# Altium schematic symbol library jlcpcb_2025_04_inductors_extended_0402.schlib: 1396 symbols (part 2 of 8) (continued)
## L-07C2N7SV6T (continued)
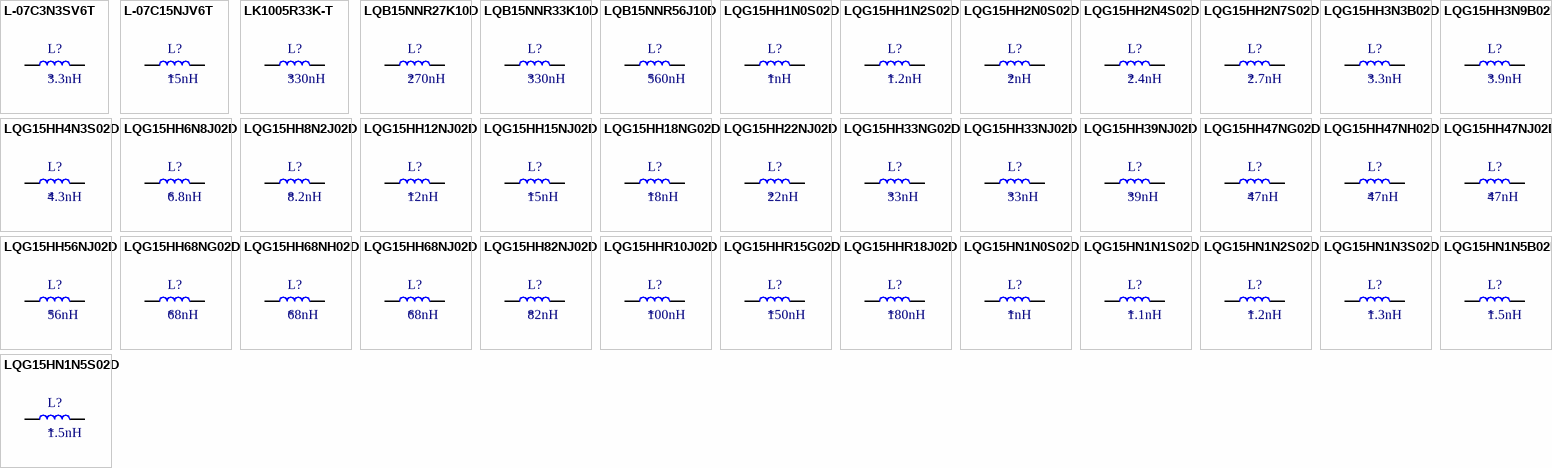
[diagram p7: symbols L-07C3N3SV6T to LQG15HN1N5S02D]

## L-07C3N3SV6T
designator L?  Inductance: 3.3nH
Inductor, 3.3nH, 190mΩ, 300mA, SMD 0402; Manufacturer: Johanson Dielectrics; Manufacturer Part Number: L-07C3N3SV6T; Self-Resonant Frequency: 8.5GHz; Q Factor: 8@100MHz; Package Size: 0402; JLCPCB Basic Part: No; JLCPCB Part Number: C5338661; Supplier 1: LCSC; Category: Inductors; Supplier Part Number 1: C5338661; Rated Current: 300mA; DC Resistance: 190mΩ; RoHS: Yes; ComponentLink1Description: Datasheet; ComponentLink1URL: https://wmsc.lcsc.com/wmsc/upload/file/pdf/v2/lcsc/2212192008_Johanson-Dielectrics-L-07C3N3SV6T_C5338661.pdf; ComponentLink2Description: JLCPCB Part URL; ComponentLink2URL: https://jlcpcb.com/partdetail/C5338661; ComponentLink3Description: LCSC Part URL; ComponentLink3URL: https://lcsc.com/product-detail/Inductors-SMD_Johanson-Dielectrics-Johanson-Dielectrics-L-07C3N3SV6T_C5338661.html
footprint IND-0402 (0402 (1005M) Inductor)
pins: 1, 2

## L-07C15NJV6T
designator L?  Inductance: 15nH
Inductor, 15nH, ±5%, 600mΩ, 250mA, SMD 0402; Manufacturer: Johanson Dielectrics; Manufacturer Part Number: L-07C15NJV6T; Q Factor: 8@100MHz; Package Size: 0402; JLCPCB Basic Part: No; JLCPCB Part Number: C2917773; Supplier 1: LCSC; Category: Inductors; Supplier Part Number 1: C2917773; Tolerance: ±5%; Rated Current: 250mA; DC Resistance: 600mΩ; RoHS: Yes; ComponentLink1Description: Datasheet; ComponentLink1URL: https://wmsc.lcsc.com/wmsc/upload/file/pdf/v2/lcsc/2203311630_Johanson-Dielectrics-L-07C15NJV6T_C2917773.pdf; ComponentLink2Description: JLCPCB Part URL; ComponentLink2URL: https://jlcpcb.com/partdetail/C2917773; ComponentLink3Description: LCSC Part URL; ComponentLink3URL: https://lcsc.com/product-detail/Inductors-SMD_Johanson-Dielectrics-Johanson-Dielectrics-L-07C15NJV6T_C2917773.html
footprint IND-0402 (0402 (1005M) Inductor)
pins: 1, 2

## LK1005R33K-T
designator L?  Inductance: 330nH
Inductor, 330nH, ±10%, 1.05Ω, 25mA, SMD 0402; Manufacturer: Taiyo Yuden; Manufacturer Part Number: LK1005R33K-T; Q Factor: 10@25MHz; Package Size: 0402; JLCPCB Basic Part: No; JLCPCB Part Number: C524943; Supplier 1: LCSC; Category: Inductors; Supplier Part Number 1: C524943; Tolerance: ±10%; Rated Current: 25mA; DC Resistance: 1.05Ω; RoHS: Yes; ComponentLink1Description: Datasheet; ComponentLink1URL: https://wmsc.lcsc.com/wmsc/upload/file/pdf/v2/lcsc/2006241834_Taiyo-Yuden-LK1005R33K-T_C524943.pdf; ComponentLink2Description: JLCPCB Part URL; ComponentLink2URL: https://jlcpcb.com/partdetail/C524943; ComponentLink3Description: LCSC Part URL; ComponentLink3URL: https://lcsc.com/product-detail/Inductors-SMD_Taiyo-Yuden-Taiyo-Yuden-LK1005R33K-T_C524943.html
footprint IND-0402 (0402 (1005M) Inductor)
pins: 1, 2

## LQB15NNR27K10D
designator L?  Inductance: 270nH
Inductor, 270nH, ±10%, 410mΩ, 330mA, SMD 0402; Manufacturer: Murata Electronics; Manufacturer Part Number: LQB15NNR27K10D; Self-Resonant Frequency: 80MHz; Q Factor: 10@25MHz; Package Size: 0402; JLCPCB Basic Part: No; JLCPCB Part Number: C907954; Supplier 1: LCSC; Category: Inductors; Supplier Part Number 1: C907954; Tolerance: ±10%; Rated Current: 330mA; DC Resistance: 410mΩ; RoHS: Yes; ComponentLink1Description: Datasheet; ComponentLink1URL: https://wmsc.lcsc.com/wmsc/upload/file/pdf/v2/lcsc/2304140030_Murata-Electronics-LQB15NNR27K10D_C907954.pdf; ComponentLink2Description: JLCPCB Part URL; ComponentLink2URL: https://jlcpcb.com/partdetail/C907954; ComponentLink3Description: LCSC Part URL; ComponentLink3URL: https://lcsc.com/product-detail/Inductors-SMD_Murata-Electronics-Murata-Electronics-LQB15NNR27K10D_C907954.html
footprint IND-0402 (0402 (1005M) Inductor)
pins: 1, 2

## LQB15NNR33K10D
designator L?  Inductance: 330nH
Inductor, 330nH, ±10%, 480mΩ, 300mA, SMD 0402; Manufacturer: Murata Electronics; Manufacturer Part Number: LQB15NNR33K10D; Self-Resonant Frequency: 80MHz; Q Factor: 10@25MHz; Package Size: 0402; JLCPCB Basic Part: No; JLCPCB Part Number: C907953; Supplier 1: LCSC; Category: Inductors; Supplier Part Number 1: C907953; Tolerance: ±10%; Rated Current: 300mA; DC Resistance: 480mΩ; RoHS: Yes; ComponentLink1Description: Datasheet; ComponentLink1URL: https://wmsc.lcsc.com/wmsc/upload/file/pdf/v2/lcsc/2304140030_Murata-Electronics-LQB15NNR33K10D_C907953.pdf; ComponentLink2Description: JLCPCB Part URL; ComponentLink2URL: https://jlcpcb.com/partdetail/C907953; ComponentLink3Description: LCSC Part URL; ComponentLink3URL: https://lcsc.com/product-detail/Inductors-SMD_Murata-Electronics-Murata-Electronics-LQB15NNR33K10D_C907953.html
footprint IND-0402 (0402 (1005M) Inductor)
pins: 1, 2

## LQB15NNR56J10D
designator L?  Inductance: 560nH
Inductor, 560nH, ±5%, 730mΩ, 300mA, SMD 0402; Manufacturer: Murata Electronics; Manufacturer Part Number: LQB15NNR56J10D; Self-Resonant Frequency: 80MHz; Q Factor: 10@25MHz; Package Size: 0402; JLCPCB Basic Part: No; JLCPCB Part Number: C269781; Supplier 1: LCSC; Category: Inductors; Supplier Part Number 1: C269781; Tolerance: ±5%; Rated Current: 300mA; DC Resistance: 730mΩ; RoHS: Yes; ComponentLink1Description: Datasheet; ComponentLink1URL: https://wmsc.lcsc.com/wmsc/upload/file/pdf/v2/lcsc/2304140030_Murata-Electronics-LQB15NNR56J10D_C269781.pdf; ComponentLink2Description: JLCPCB Part URL; ComponentLink2URL: https://jlcpcb.com/partdetail/C269781; ComponentLink3Description: LCSC Part URL; ComponentLink3URL: https://lcsc.com/product-detail/Inductors-SMD_Murata-Electronics-Murata-Electronics-LQB15NNR56J10D_C269781.html
footprint IND-0402 (0402 (1005M) Inductor)
pins: 1, 2

## LQG15HH1N0S02D
designator L?  Inductance: 1nH
Inductor, 1nH, 70mΩ, 1A, SMD 0402; Manufacturer: Murata Electronics; Manufacturer Part Number: LQG15HH1N0S02D; Self-Resonant Frequency: 10GHz; Q Factor: 8@100MHz; Package Size: 0402; JLCPCB Basic Part: No; JLCPCB Part Number: C237608; Supplier 1: LCSC; Category: Inductors; Supplier Part Number 1: C237608; Rated Current: 1A; DC Resistance: 70mΩ; RoHS: Yes; ComponentLink1Description: Datasheet; ComponentLink1URL: https://wmsc.lcsc.com/wmsc/upload/file/pdf/v2/lcsc/2304140030_Murata-Electronics-LQG15HH1N0S02D_C237608.pdf; ComponentLink2Description: JLCPCB Part URL; ComponentLink2URL: https://jlcpcb.com/partdetail/C237608; ComponentLink3Description: LCSC Part URL; ComponentLink3URL: https://lcsc.com/product-detail/Inductors-SMD_Murata-Electronics-Murata-Electronics-LQG15HH1N0S02D_C237608.html
footprint IND-0402 (0402 (1005M) Inductor)
pins: 1, 2

## LQG15HH1N2S02D
designator L?  Inductance: 1.2nH
Inductor, 1.2nH, 70mΩ, 300mA, SMD 0402; Manufacturer: Murata Electronics; Manufacturer Part Number: LQG15HH1N2S02D; Self-Resonant Frequency: 6GHz; Q Factor: 8@100MHz; Package Size: 0402; JLCPCB Basic Part: No; JLCPCB Part Number: C1852697; Supplier 1: LCSC; Category: Inductors; Supplier Part Number 1: C1852697; Rated Current: 300mA; DC Resistance: 70mΩ; RoHS: Yes; ComponentLink1Description: Datasheet; ComponentLink1URL: https://wmsc.lcsc.com/wmsc/upload/file/pdf/v2/lcsc/2304140030_Murata-Electronics-LQG15HH1N2S02D_C1852697.pdf; ComponentLink2Description: JLCPCB Part URL; ComponentLink2URL: https://jlcpcb.com/partdetail/C1852697; ComponentLink3Description: LCSC Part URL; ComponentLink3URL: https://lcsc.com/product-detail/Inductors-SMD_Murata-Electronics-Murata-Electronics-LQG15HH1N2S02D_C1852697.html
footprint IND-0402 (0402 (1005M) Inductor)
pins: 1, 2

## LQG15HH2N0S02D
designator L?  Inductance: 2nH
Inductor, 2nH, 90mΩ, 900mA, SMD 0402; Manufacturer: Murata Electronics; Manufacturer Part Number: LQG15HH2N0S02D; Self-Resonant Frequency: 6GHz; Q Factor: 8@100MHz; Package Size: 0402; JLCPCB Basic Part: No; JLCPCB Part Number: C162534; Supplier 1: LCSC; Category: Inductors; Supplier Part Number 1: C162534; Rated Current: 900mA; DC Resistance: 90mΩ; RoHS: Yes; ComponentLink1Description: Datasheet; ComponentLink1URL: https://wmsc.lcsc.com/wmsc/upload/file/pdf/v2/lcsc/1811081521_Murata-Electronics-LQG15HH2N0S02D_C162534.pdf; ComponentLink2Description: JLCPCB Part URL; ComponentLink2URL: https://jlcpcb.com/partdetail/C162534; ComponentLink3Description: LCSC Part URL; ComponentLink3URL: https://lcsc.com/product-detail/Inductors-SMD_Murata-Electronics-Murata-Electronics-LQG15HH2N0S02D_C162534.html
footprint IND-0402 (0402 (1005M) Inductor)
pins: 1, 2

## LQG15HH2N4S02D
designator L?  Inductance: 2.4nH
Inductor, 2.4nH, 110mΩ, 300mA, SMD 0402; Manufacturer: Murata Electronics; Manufacturer Part Number: LQG15HH2N4S02D; Self-Resonant Frequency: 6GHz; Q Factor: 8@100MHz; Package Size: 0402; JLCPCB Basic Part: No; JLCPCB Part Number: C602035; Supplier 1: LCSC; Category: Inductors; Supplier Part Number 1: C602035; Rated Current: 300mA; DC Resistance: 110mΩ; RoHS: Yes; ComponentLink1Description: Datasheet; ComponentLink1URL: https://wmsc.lcsc.com/wmsc/upload/file/pdf/v2/lcsc/2006122120_Murata-Electronics-LQG15HH2N4S02D_C602035.pdf; ComponentLink2Description: JLCPCB Part URL; ComponentLink2URL: https://jlcpcb.com/partdetail/C602035; ComponentLink3Description: LCSC Part URL; ComponentLink3URL: https://lcsc.com/product-detail/Inductors-SMD_Murata-Electronics-Murata-Electronics-LQG15HH2N4S02D_C602035.html
footprint IND-0402 (0402 (1005M) Inductor)
pins: 1, 2

## LQG15HH2N7S02D
designator L?  Inductance: 2.7nH
Inductor, 2.7nH, 120mΩ, 300mA, SMD 0402; Manufacturer: Murata Electronics; Manufacturer Part Number: LQG15HH2N7S02D; Self-Resonant Frequency: 6GHz; Q Factor: 8@100MHz; Package Size: 0402; JLCPCB Basic Part: No; JLCPCB Part Number: C354349; Supplier 1: LCSC; Category: Inductors; Supplier Part Number 1: C354349; Rated Current: 300mA; DC Resistance: 120mΩ; RoHS: Yes; ComponentLink1Description: Datasheet; ComponentLink1URL: https://wmsc.lcsc.com/wmsc/upload/file/pdf/v2/lcsc/1912111437_Murata-Electronics-LQG15HH2N7S02D_C354349.pdf; ComponentLink2Description: JLCPCB Part URL; ComponentLink2URL: https://jlcpcb.com/partdetail/C354349; ComponentLink3Description: LCSC Part URL; ComponentLink3URL: https://lcsc.com/product-detail/Inductors-SMD_Murata-Electronics-Murata-Electronics-LQG15HH2N7S02D_C354349.html
footprint IND-0402 (0402 (1005M) Inductor)
pins: 1, 2

## LQG15HH3N3B02D
designator L?  Inductance: 3.3nH
Inductor, 3.3nH, SMD 0402; Manufacturer: Murata Electronics; Manufacturer Part Number: LQG15HH3N3B02D; Package Size: 0402; JLCPCB Basic Part: No; JLCPCB Part Number: C2981735; Supplier 1: LCSC; Category: Inductors; Supplier Part Number 1: C2981735; RoHS: Yes; ComponentLink1Description: Datasheet; ComponentLink1URL: https://wmsc.lcsc.com/wmsc/upload/file/pdf/v2/lcsc/2206221715_Murata-Electronics-LQG15HH3N3B02D_C2981735.pdf; ComponentLink2Description: JLCPCB Part URL; ComponentLink2URL: https://jlcpcb.com/partdetail/C2981735; ComponentLink3Description: LCSC Part URL; ComponentLink3URL: https://lcsc.com/product-detail/Inductors-SMD_Murata-Electronics-Murata-Electronics-LQG15HH3N3B02D_C2981735.html
footprint IND-0402 (0402 (1005M) Inductor)
pins: 1, 2

## LQG15HH3N9B02D
designator L?  Inductance: 3.9nH
Inductor, 3.9nH, 140mΩ, SMD 0402; Manufacturer: Murata Electronics; Manufacturer Part Number: LQG15HH3N9B02D; Self-Resonant Frequency: 6GHz; Q Factor: 8@100MHz; Package Size: 0402; JLCPCB Basic Part: No; JLCPCB Part Number: C907911; Supplier 1: LCSC; Category: Inductors; Supplier Part Number 1: C907911; DC Resistance: 140mΩ; RoHS: Yes; ComponentLink1Description: Datasheet; ComponentLink1URL: https://wmsc.lcsc.com/wmsc/upload/file/pdf/v2/lcsc/2201242100_Murata-Electronics-LQG15HH3N9B02D_C907911.pdf; ComponentLink2Description: JLCPCB Part URL; ComponentLink2URL: https://jlcpcb.com/partdetail/C907911; ComponentLink3Description: LCSC Part URL; ComponentLink3URL: https://lcsc.com/product-detail/Inductors-SMD_Murata-Electronics-Murata-Electronics-LQG15HH3N9B02D_C907911.html
footprint IND-0402 (0402 (1005M) Inductor)
pins: 1, 2

## LQG15HH4N3S02D
designator L?  Inductance: 4.3nH
Inductor, 4.3nH, 140mΩ, 300mA, SMD 0402; Manufacturer: Murata Electronics; Manufacturer Part Number: LQG15HH4N3S02D; Self-Resonant Frequency: 6GHz; Q Factor: 8@100MHz; Package Size: 0402; JLCPCB Basic Part: No; JLCPCB Part Number: C269782; Supplier 1: LCSC; Category: Inductors; Supplier Part Number 1: C269782; Rated Current: 300mA; DC Resistance: 140mΩ; RoHS: Yes; ComponentLink1Description: Datasheet; ComponentLink1URL: https://wmsc.lcsc.com/wmsc/upload/file/pdf/v2/lcsc/2304140030_Murata-Electronics-LQG15HH4N3S02D_C269782.pdf; ComponentLink2Description: JLCPCB Part URL; ComponentLink2URL: https://jlcpcb.com/partdetail/C269782; ComponentLink3Description: LCSC Part URL; ComponentLink3URL: https://lcsc.com/product-detail/Inductors-SMD_Murata-Electronics-Murata-Electronics-LQG15HH4N3S02D_C269782.html
footprint IND-0402 (0402 (1005M) Inductor)
pins: 1, 2

## LQG15HH6N8J02D
designator L?  Inductance: 6.8nH
Inductor, 6.8nH, ±5%, 220mΩ, 600mA, SMD 0402; Manufacturer: Murata Electronics; Manufacturer Part Number: LQG15HH6N8J02D; Self-Resonant Frequency: 4.5GHz; Q Factor: 8@100MHz; Package Size: 0402; JLCPCB Basic Part: No; JLCPCB Part Number: C440214; Supplier 1: LCSC; Category: Inductors; Supplier Part Number 1: C440214; Tolerance: ±5%; Rated Current: 600mA; DC Resistance: 220mΩ; RoHS: Yes; ComponentLink1Description: Datasheet; ComponentLink1URL: https://wmsc.lcsc.com/wmsc/upload/file/pdf/v2/lcsc/2304140030_Murata-Electronics-LQG15HH6N8J02D_C440214.pdf; ComponentLink2Description: JLCPCB Part URL; ComponentLink2URL: https://jlcpcb.com/partdetail/C440214; ComponentLink3Description: LCSC Part URL; ComponentLink3URL: https://lcsc.com/product-detail/Inductors-SMD_Murata-Electronics-Murata-Electronics-LQG15HH6N8J02D_C440214.html
footprint IND-0402 (0402 (1005M) Inductor)
pins: 1, 2

## LQG15HH8N2J02D
designator L?  Inductance: 8.2nH
Inductor, 8.2nH, ±5%, 240mΩ, 550mA, SMD 0402; Manufacturer: Murata Electronics; Manufacturer Part Number: LQG15HH8N2J02D; Self-Resonant Frequency: 3.7GHz; Q Factor: 8@100MHz; Package Size: 0402; JLCPCB Basic Part: No; JLCPCB Part Number: C237609; Supplier 1: LCSC; Category: Inductors; Supplier Part Number 1: C237609; Tolerance: ±5%; Rated Current: 550mA; DC Resistance: 240mΩ; RoHS: Yes; ComponentLink1Description: Datasheet; ComponentLink1URL: https://wmsc.lcsc.com/wmsc/upload/file/pdf/v2/lcsc/2304140030_Murata-Electronics-LQG15HH8N2J02D_C237609.pdf; ComponentLink2Description: JLCPCB Part URL; ComponentLink2URL: https://jlcpcb.com/partdetail/C237609; ComponentLink3Description: LCSC Part URL; ComponentLink3URL: https://lcsc.com/product-detail/Inductors-SMD_Murata-Electronics-Murata-Electronics-LQG15HH8N2J02D_C237609.html
footprint IND-0402 (0402 (1005M) Inductor)
pins: 1, 2

## LQG15HH12NJ02D
designator L?  Inductance: 12nH
Inductor, 12nH, ±5%, 280mΩ, 300mA, SMD 0402; Manufacturer: Murata Electronics; Manufacturer Part Number: LQG15HH12NJ02D; Self-Resonant Frequency: 3GHz; Q Factor: 8@100MHz; Package Size: 0402; JLCPCB Basic Part: No; JLCPCB Part Number: C426650; Supplier 1: LCSC; Category: Inductors; Supplier Part Number 1: C426650; Tolerance: ±5%; Rated Current: 300mA; DC Resistance: 280mΩ; RoHS: Yes; ComponentLink1Description: Datasheet; ComponentLink1URL: https://wmsc.lcsc.com/wmsc/upload/file/pdf/v2/lcsc/2304140030_Murata-Electronics-LQG15HH12NJ02D_C426650.pdf; ComponentLink2Description: JLCPCB Part URL; ComponentLink2URL: https://jlcpcb.com/partdetail/C426650; ComponentLink3Description: LCSC Part URL; ComponentLink3URL: https://lcsc.com/product-detail/Inductors-SMD_Murata-Electronics-Murata-Electronics-LQG15HH12NJ02D_C426650.html
footprint IND-0402 (0402 (1005M) Inductor)
pins: 1, 2

## LQG15HH15NJ02D
designator L?  Inductance: 15nH
Inductor, 15nH, ±5%, 320mΩ, 300mA, SMD 0402; Manufacturer: Murata Electronics; Manufacturer Part Number: LQG15HH15NJ02D; Self-Resonant Frequency: 2.5GHz; Q Factor: 8@100MHz; Package Size: 0402; JLCPCB Basic Part: No; JLCPCB Part Number: C237327; Supplier 1: LCSC; Category: Inductors; Supplier Part Number 1: C237327; Tolerance: ±5%; Rated Current: 300mA; DC Resistance: 320mΩ; RoHS: Yes; ComponentLink1Description: Datasheet; ComponentLink1URL: https://wmsc.lcsc.com/wmsc/upload/file/pdf/v2/lcsc/2304140030_Murata-Electronics-LQG15HH15NJ02D_C237327.pdf; ComponentLink2Description: JLCPCB Part URL; ComponentLink2URL: https://jlcpcb.com/partdetail/C237327; ComponentLink3Description: LCSC Part URL; ComponentLink3URL: https://lcsc.com/product-detail/Inductors-SMD_Murata-Electronics-Murata-Electronics-LQG15HH15NJ02D_C237327.html
footprint IND-0402 (0402 (1005M) Inductor)
pins: 1, 2

## LQG15HH18NG02D
designator L?  Inductance: 18nH
Inductor, 18nH, ±2%, 360mΩ, 400mA, SMD 0402; Manufacturer: Murata Electronics; Manufacturer Part Number: LQG15HH18NG02D; Self-Resonant Frequency: 2.2GHz; Q Factor: 8@100MHz; Package Size: 0402; JLCPCB Basic Part: No; JLCPCB Part Number: C907971; Supplier 1: LCSC; Category: Inductors; Supplier Part Number 1: C907971; Tolerance: ±2%; Rated Current: 400mA; DC Resistance: 360mΩ; RoHS: Yes; ComponentLink1Description: Datasheet; ComponentLink1URL: https://wmsc.lcsc.com/wmsc/upload/file/pdf/v2/lcsc/2201242100_Murata-Electronics-LQG15HH18NG02D_C907971.pdf; ComponentLink2Description: JLCPCB Part URL; ComponentLink2URL: https://jlcpcb.com/partdetail/C907971; ComponentLink3Description: LCSC Part URL; ComponentLink3URL: https://lcsc.com/product-detail/Inductors-SMD_Murata-Electronics-Murata-Electronics-LQG15HH18NG02D_C907971.html
footprint IND-0402 (0402 (1005M) Inductor)
pins: 1, 2

## LQG15HH22NJ02D
designator L?  Inductance: 22nH
Inductor, 22nH, ±5%, 420mΩ, 300mA, SMD 0402; Manufacturer: Murata Electronics; Manufacturer Part Number: LQG15HH22NJ02D; Self-Resonant Frequency: 1.9GHz; Q Factor: 8@100MHz; Package Size: 0402; JLCPCB Basic Part: No; JLCPCB Part Number: C882499; Supplier 1: LCSC; Category: Inductors; Supplier Part Number 1: C882499; Tolerance: ±5%; Rated Current: 300mA; DC Resistance: 420mΩ; RoHS: Yes; ComponentLink1Description: Datasheet; ComponentLink1URL: https://wmsc.lcsc.com/wmsc/upload/file/pdf/v2/lcsc/2201242130_Murata-Electronics-LQG15HH22NJ02D_C882499.pdf; ComponentLink2Description: JLCPCB Part URL; ComponentLink2URL: https://jlcpcb.com/partdetail/C882499; ComponentLink3Description: LCSC Part URL; ComponentLink3URL: https://lcsc.com/product-detail/Inductors-SMD_Murata-Electronics-Murata-Electronics-LQG15HH22NJ02D_C882499.html
footprint IND-0402 (0402 (1005M) Inductor)
pins: 1, 2

## LQG15HH33NG02D
designator L?  Inductance: 33nH
Inductor, 33nH, ±2%, 580mΩ, 350mA, SMD 0402; Manufacturer: Murata Electronics; Manufacturer Part Number: LQG15HH33NG02D; Self-Resonant Frequency: 1.6GHz; Q Factor: 8@100MHz; Package Size: 0402; JLCPCB Basic Part: No; JLCPCB Part Number: C471373; Supplier 1: LCSC; Category: Inductors; Supplier Part Number 1: C471373; Tolerance: ±2%; Rated Current: 350mA; DC Resistance: 580mΩ; RoHS: Yes; ComponentLink1Description: Datasheet; ComponentLink1URL: https://wmsc.lcsc.com/wmsc/upload/file/pdf/v2/lcsc/2001081823_Murata-Electronics-LQG15HH33NG02D_C471373.pdf; ComponentLink2Description: JLCPCB Part URL; ComponentLink2URL: https://jlcpcb.com/partdetail/C471373; ComponentLink3Description: LCSC Part URL; ComponentLink3URL: https://lcsc.com/product-detail/Inductors-SMD_Murata-Electronics-Murata-Electronics-LQG15HH33NG02D_C471373.html
footprint IND-0402 (0402 (1005M) Inductor)
pins: 1, 2

## LQG15HH33NJ02D
designator L?  Inductance: 33nH
Inductor, 33nH, ±5%, 580mΩ, 350mA, SMD 0402; Manufacturer: Murata Electronics; Manufacturer Part Number: LQG15HH33NJ02D; Self-Resonant Frequency: 1.6GHz; Q Factor: 8@100MHz; Package Size: 0402; JLCPCB Basic Part: No; JLCPCB Part Number: C783272; Supplier 1: LCSC; Category: Inductors; Supplier Part Number 1: C783272; Tolerance: ±5%; Rated Current: 350mA; DC Resistance: 580mΩ; RoHS: Yes; ComponentLink1Description: Datasheet; ComponentLink1URL: https://wmsc.lcsc.com/wmsc/upload/file/pdf/v2/lcsc/2009121108_Murata-Electronics-LQG15HH33NJ02D_C783272.pdf; ComponentLink2Description: JLCPCB Part URL; ComponentLink2URL: https://jlcpcb.com/partdetail/C783272; ComponentLink3Description: LCSC Part URL; ComponentLink3URL: https://lcsc.com/product-detail/Inductors-SMD_Murata-Electronics-Murata-Electronics-LQG15HH33NJ02D_C783272.html
footprint IND-0402 (0402 (1005M) Inductor)
pins: 1, 2

## LQG15HH39NJ02D
designator L?  Inductance: 39nH
Inductor, 39nH, ±5%, 650mΩ, 300mA, SMD 0402; Manufacturer: Murata Electronics; Manufacturer Part Number: LQG15HH39NJ02D; Self-Resonant Frequency: 1.2GHz; Q Factor: 8@100MHz; Package Size: 0402; JLCPCB Basic Part: No; JLCPCB Part Number: C440213; Supplier 1: LCSC; Category: Inductors; Supplier Part Number 1: C440213; Tolerance: ±5%; Rated Current: 300mA; DC Resistance: 650mΩ; RoHS: Yes; ComponentLink1Description: Datasheet; ComponentLink1URL: https://wmsc.lcsc.com/wmsc/upload/file/pdf/v2/lcsc/2304140030_Murata-Electronics-LQG15HH39NJ02D_C440213.pdf; ComponentLink2Description: JLCPCB Part URL; ComponentLink2URL: https://jlcpcb.com/partdetail/C440213; ComponentLink3Description: LCSC Part URL; ComponentLink3URL: https://lcsc.com/product-detail/Inductors-SMD_Murata-Electronics-Murata-Electronics-LQG15HH39NJ02D_C440213.html
footprint IND-0402 (0402 (1005M) Inductor)
pins: 1, 2

## LQG15HH47NG02D
designator L?  Inductance: 47nH
Inductor, 47nH, ±2%, 720mΩ, 300mA, SMD 0402; Manufacturer: Murata Electronics; Manufacturer Part Number: LQG15HH47NG02D; Self-Resonant Frequency: 1GHz; Q Factor: 8@100MHz; Package Size: 0402; JLCPCB Basic Part: No; JLCPCB Part Number: C471397; Supplier 1: LCSC; Category: Inductors; Supplier Part Number 1: C471397; Tolerance: ±2%; Rated Current: 300mA; DC Resistance: 720mΩ; RoHS: Yes; ComponentLink1Description: Datasheet; ComponentLink1URL: https://wmsc.lcsc.com/wmsc/upload/file/pdf/v2/lcsc/2001081823_Murata-Electronics-LQG15HH47NG02D_C471397.pdf; ComponentLink2Description: JLCPCB Part URL; ComponentLink2URL: https://jlcpcb.com/partdetail/C471397; ComponentLink3Description: LCSC Part URL; ComponentLink3URL: https://lcsc.com/product-detail/Inductors-SMD_Murata-Electronics-Murata-Electronics-LQG15HH47NG02D_C471397.html
footprint IND-0402 (0402 (1005M) Inductor)
pins: 1, 2

## LQG15HH47NH02D
designator L?  Inductance: 47nH
Inductor, 47nH, ±3%, 720mΩ, 300mA, SMD 0402; Manufacturer: Murata Electronics; Manufacturer Part Number: LQG15HH47NH02D; Self-Resonant Frequency: 1GHz; Q Factor: 8@100MHz; Package Size: 0402; JLCPCB Basic Part: No; JLCPCB Part Number: C2042001; Supplier 1: LCSC; Category: Inductors; Supplier Part Number 1: C2042001; Tolerance: ±3%; Rated Current: 300mA; DC Resistance: 720mΩ; RoHS: Yes; ComponentLink1Description: Datasheet; ComponentLink1URL: https://wmsc.lcsc.com/wmsc/upload/file/pdf/v2/lcsc/2304140030_Murata-Electronics-LQG15HH47NH02D_C2042001.pdf; ComponentLink2Description: JLCPCB Part URL; ComponentLink2URL: https://jlcpcb.com/partdetail/C2042001; ComponentLink3Description: LCSC Part URL; ComponentLink3URL: https://lcsc.com/product-detail/Inductors-SMD_Murata-Electronics-Murata-Electronics-LQG15HH47NH02D_C2042001.html
footprint IND-0402 (0402 (1005M) Inductor)
pins: 1, 2

## LQG15HH47NJ02D
designator L?  Inductance: 47nH
Inductor, 47nH, ±5%, 720mΩ, 300mA, SMD 0402; Manufacturer: Murata Electronics; Manufacturer Part Number: LQG15HH47NJ02D; Self-Resonant Frequency: 1GHz; Q Factor: 8@100MHz; Package Size: 0402; JLCPCB Basic Part: No; JLCPCB Part Number: C162535; Supplier 1: LCSC; Category: Inductors; Supplier Part Number 1: C162535; Tolerance: ±5%; Rated Current: 300mA; DC Resistance: 720mΩ; RoHS: Yes; ComponentLink1Description: Datasheet; ComponentLink1URL: https://wmsc.lcsc.com/wmsc/upload/file/pdf/v2/lcsc/1811081521_Murata-Electronics-LQG15HH47NJ02D_C162535.pdf; ComponentLink2Description: JLCPCB Part URL; ComponentLink2URL: https://jlcpcb.com/partdetail/C162535; ComponentLink3Description: LCSC Part URL; ComponentLink3URL: https://lcsc.com/product-detail/Inductors-SMD_Murata-Electronics-Murata-Electronics-LQG15HH47NJ02D_C162535.html
footprint IND-0402 (0402 (1005M) Inductor)
pins: 1, 2

## LQG15HH56NJ02D
designator L?  Inductance: 56nH
Inductor, 56nH, ±5%, 820mΩ, 200mA, SMD 0402; Manufacturer: Murata Electronics; Manufacturer Part Number: LQG15HH56NJ02D; Self-Resonant Frequency: 800MHz; Q Factor: 8@100MHz; Package Size: 0402; JLCPCB Basic Part: No; JLCPCB Part Number: C435416; Supplier 1: LCSC; Category: Inductors; Supplier Part Number 1: C435416; Tolerance: ±5%; Rated Current: 200mA; DC Resistance: 820mΩ; RoHS: Yes; ComponentLink1Description: Datasheet; ComponentLink1URL: https://wmsc.lcsc.com/wmsc/upload/file/pdf/v2/lcsc/1912111437_Murata-Electronics-LQG15HH56NJ02D_C435416.pdf; ComponentLink2Description: JLCPCB Part URL; ComponentLink2URL: https://jlcpcb.com/partdetail/C435416; ComponentLink3Description: LCSC Part URL; ComponentLink3URL: https://lcsc.com/product-detail/Inductors-SMD_Murata-Electronics-Murata-Electronics-LQG15HH56NJ02D_C435416.html
footprint IND-0402 (0402 (1005M) Inductor)
pins: 1, 2

## LQG15HH68NG02D
designator L?  Inductance: 68nH
Inductor, 68nH, ±2%, 920mΩ, 250mA, SMD 0402; Manufacturer: Murata Electronics; Manufacturer Part Number: LQG15HH68NG02D; Self-Resonant Frequency: 800MHz; Q Factor: 8@100MHz; Package Size: 0402; JLCPCB Basic Part: No; JLCPCB Part Number: C907970; Supplier 1: LCSC; Category: Inductors; Supplier Part Number 1: C907970; Tolerance: ±2%; Rated Current: 250mA; DC Resistance: 920mΩ; RoHS: Yes; ComponentLink1Description: Datasheet; ComponentLink1URL: https://wmsc.lcsc.com/wmsc/upload/file/pdf/v2/lcsc/2201242100_Murata-Electronics-LQG15HH68NG02D_C907970.pdf; ComponentLink2Description: JLCPCB Part URL; ComponentLink2URL: https://jlcpcb.com/partdetail/C907970; ComponentLink3Description: LCSC Part URL; ComponentLink3URL: https://lcsc.com/product-detail/Inductors-SMD_Murata-Electronics-Murata-Electronics-LQG15HH68NG02D_C907970.html
footprint IND-0402 (0402 (1005M) Inductor)
pins: 1, 2

## LQG15HH68NH02D
designator L?  Inductance: 68nH
Inductor, 68nH, ±3%, 920mΩ, 250mA, SMD 0402; Manufacturer: Murata Electronics; Manufacturer Part Number: LQG15HH68NH02D; Self-Resonant Frequency: 800MHz; Q Factor: 8@100MHz; Package Size: 0402; JLCPCB Basic Part: No; JLCPCB Part Number: C2043913; Supplier 1: LCSC; Category: Inductors; Supplier Part Number 1: C2043913; Tolerance: ±3%; Rated Current: 250mA; DC Resistance: 920mΩ; RoHS: Yes; ComponentLink1Description: Datasheet; ComponentLink1URL: https://wmsc.lcsc.com/wmsc/upload/file/pdf/v2/lcsc/2304140030_Murata-Electronics-LQG15HH68NH02D_C2043913.pdf; ComponentLink2Description: JLCPCB Part URL; ComponentLink2URL: https://jlcpcb.com/partdetail/C2043913; ComponentLink3Description: LCSC Part URL; ComponentLink3URL: https://lcsc.com/product-detail/Inductors-SMD_Murata-Electronics-Murata-Electronics-LQG15HH68NH02D_C2043913.html
footprint IND-0402 (0402 (1005M) Inductor)
pins: 1, 2

## LQG15HH68NJ02D
designator L?  Inductance: 68nH
Inductor, 68nH, ±5%, 920mΩ, 180mA, SMD 0402; Manufacturer: Murata Electronics; Manufacturer Part Number: LQG15HH68NJ02D; Self-Resonant Frequency: 800MHz; Q Factor: 8@100MHz; Package Size: 0402; JLCPCB Basic Part: No; JLCPCB Part Number: C426642; Supplier 1: LCSC; Category: Inductors; Supplier Part Number 1: C426642; Tolerance: ±5%; Rated Current: 180mA; DC Resistance: 920mΩ; RoHS: Yes; ComponentLink1Description: Datasheet; ComponentLink1URL: https://wmsc.lcsc.com/wmsc/upload/file/pdf/v2/lcsc/2304140030_Murata-Electronics-LQG15HH68NJ02D_C426642.pdf; ComponentLink2Description: JLCPCB Part URL; ComponentLink2URL: https://jlcpcb.com/partdetail/C426642; ComponentLink3Description: LCSC Part URL; ComponentLink3URL: https://lcsc.com/product-detail/Inductors-SMD_Murata-Electronics-Murata-Electronics-LQG15HH68NJ02D_C426642.html
footprint IND-0402 (0402 (1005M) Inductor)
pins: 1, 2

## LQG15HH82NJ02D
designator L?  Inductance: 82nH
Inductor, 82nH, ±5%, 1.2Ω, 150mA, SMD 0402; Manufacturer: Murata Electronics; Manufacturer Part Number: LQG15HH82NJ02D; Self-Resonant Frequency: 700MHz; Q Factor: 8@100MHz; Package Size: 0402; JLCPCB Basic Part: No; JLCPCB Part Number: C913594; Supplier 1: LCSC; Category: Inductors; Supplier Part Number 1: C913594; Tolerance: ±5%; Rated Current: 150mA; DC Resistance: 1.2Ω; RoHS: Yes; ComponentLink1Description: Datasheet; ComponentLink1URL: https://wmsc.lcsc.com/wmsc/upload/file/pdf/v2/lcsc/2304140030_Murata-Electronics-LQG15HH82NJ02D_C913594.pdf; ComponentLink2Description: JLCPCB Part URL; ComponentLink2URL: https://jlcpcb.com/partdetail/C913594; ComponentLink3Description: LCSC Part URL; ComponentLink3URL: https://lcsc.com/product-detail/Inductors-SMD_Murata-Electronics-Murata-Electronics-LQG15HH82NJ02D_C913594.html
footprint IND-0402 (0402 (1005M) Inductor)
pins: 1, 2

## LQG15HHR10J02D
designator L?  Inductance: 100nH
Inductor, 100nH, ±5%, 1.25Ω, 500mA, SMD 0402; Manufacturer: Murata Electronics; Manufacturer Part Number: LQG15HHR10J02D; Self-Resonant Frequency: 600MHz; Q Factor: 8@100MHz; Package Size: 0402; JLCPCB Basic Part: No; JLCPCB Part Number: C337898; Supplier 1: LCSC; Category: Inductors; Supplier Part Number 1: C337898; Tolerance: ±5%; Rated Current: 500mA; DC Resistance: 1.25Ω; RoHS: Yes; ComponentLink1Description: Datasheet; ComponentLink1URL: https://wmsc.lcsc.com/wmsc/upload/file/pdf/v2/lcsc/2304140030_Murata-Electronics-LQG15HHR10J02D_C337898.pdf; ComponentLink2Description: JLCPCB Part URL; ComponentLink2URL: https://jlcpcb.com/partdetail/C337898; ComponentLink3Description: LCSC Part URL; ComponentLink3URL: https://lcsc.com/product-detail/Inductors-SMD_Murata-Electronics-Murata-Electronics-LQG15HHR10J02D_C337898.html
footprint IND-0402 (0402 (1005M) Inductor)
pins: 1, 2

## LQG15HHR15G02D
designator L?  Inductance: 150nH
Inductor, 150nH, ±2%, 2.99Ω, SMD 0402; Manufacturer: Murata Electronics; Manufacturer Part Number: LQG15HHR15G02D; Self-Resonant Frequency: 550MHz; Q Factor: 8@100MHz; Package Size: 0402; JLCPCB Basic Part: No; JLCPCB Part Number: C560037; Supplier 1: LCSC; Category: Inductors; Supplier Part Number 1: C560037; Tolerance: ±2%; DC Resistance: 2.99Ω; RoHS: Yes; ComponentLink1Description: Datasheet; ComponentLink1URL: https://wmsc.lcsc.com/wmsc/upload/file/pdf/v2/lcsc/2008070932_Murata-Electronics-LQG15HHR15G02D_C560037.pdf; ComponentLink2Description: JLCPCB Part URL; ComponentLink2URL: https://jlcpcb.com/partdetail/C560037; ComponentLink3Description: LCSC Part URL; ComponentLink3URL: https://lcsc.com/product-detail/Inductors-SMD_Murata-Electronics-Murata-Electronics-LQG15HHR15G02D_C560037.html
footprint IND-0402 (0402 (1005M) Inductor)
pins: 1, 2

## LQG15HHR18J02D
designator L?  Inductance: 180nH
Inductor, 180nH, ±5%, 3.38Ω, 130mA, SMD 0402; Manufacturer: Murata Electronics; Manufacturer Part Number: LQG15HHR18J02D; Self-Resonant Frequency: 500MHz; Q Factor: 8@100MHz; Package Size: 0402; JLCPCB Basic Part: No; JLCPCB Part Number: C162536; Supplier 1: LCSC; Category: Inductors; Supplier Part Number 1: C162536; Tolerance: ±5%; Rated Current: 130mA; DC Resistance: 3.38Ω; RoHS: Yes; ComponentLink1Description: Datasheet; ComponentLink1URL: https://wmsc.lcsc.com/wmsc/upload/file/pdf/v2/lcsc/1811081524_Murata-Electronics-LQG15HHR18J02D_C162536.pdf; ComponentLink2Description: JLCPCB Part URL; ComponentLink2URL: https://jlcpcb.com/partdetail/C162536; ComponentLink3Description: LCSC Part URL; ComponentLink3URL: https://lcsc.com/product-detail/Inductors-SMD_Murata-Electronics-Murata-Electronics-LQG15HHR18J02D_C162536.html
footprint IND-0402 (0402 (1005M) Inductor)
pins: 1, 2

## LQG15HN1N0S02D
designator L?  Inductance: 1nH
Inductor, 1nH, 70mΩ, 1A, SMD 0402; Manufacturer: Murata Electronics; Manufacturer Part Number: LQG15HN1N0S02D; Self-Resonant Frequency: 6GHz; Q Factor: 8@100MHz; Package Size: 0402; JLCPCB Basic Part: No; JLCPCB Part Number: C97981; Supplier 1: LCSC; Category: Inductors; Supplier Part Number 1: C97981; Rated Current: 1A; DC Resistance: 70mΩ; RoHS: Yes; ComponentLink1Description: Datasheet; ComponentLink1URL: https://wmsc.lcsc.com/wmsc/upload/file/pdf/v2/lcsc/2304140030_Murata-Electronics-LQG15HN1N0S02D_C97981.pdf; ComponentLink2Description: JLCPCB Part URL; ComponentLink2URL: https://jlcpcb.com/partdetail/C97981; ComponentLink3Description: LCSC Part URL; ComponentLink3URL: https://lcsc.com/product-detail/Inductors-SMD_Murata-Electronics-Murata-Electronics-LQG15HN1N0S02D_C97981.html
footprint IND-0402 (0402 (1005M) Inductor)
pins: 1, 2

## LQG15HN1N1S02D
designator L?  Inductance: 1.1nH
Inductor, 1.1nH, 80mΩ, 1A, SMD 0402; Manufacturer: Murata Electronics; Manufacturer Part Number: LQG15HN1N1S02D; Self-Resonant Frequency: 6GHz; Q Factor: 8@100MHz; Package Size: 0402; JLCPCB Basic Part: No; JLCPCB Part Number: C184300; Supplier 1: LCSC; Category: Inductors; Supplier Part Number 1: C184300; Rated Current: 1A; DC Resistance: 80mΩ; RoHS: Yes; ComponentLink1Description: Datasheet; ComponentLink1URL: https://wmsc.lcsc.com/wmsc/upload/file/pdf/v2/lcsc/2304140030_Murata-Electronics-LQG15HN1N1S02D_C184300.pdf; ComponentLink2Description: JLCPCB Part URL; ComponentLink2URL: https://jlcpcb.com/partdetail/C184300; ComponentLink3Description: LCSC Part URL; ComponentLink3URL: https://lcsc.com/product-detail/Inductors-SMD_Murata-Electronics-Murata-Electronics-LQG15HN1N1S02D_C184300.html
footprint IND-0402 (0402 (1005M) Inductor)
pins: 1, 2

## LQG15HN1N2S02D
designator L?  Inductance: 1.2nH
Inductor, 1.2nH, 80mΩ, 1A, SMD 0402; Manufacturer: Murata Electronics; Manufacturer Part Number: LQG15HN1N2S02D; Self-Resonant Frequency: 6GHz; Q Factor: 8@100MHz; Package Size: 0402; JLCPCB Basic Part: No; JLCPCB Part Number: C162537; Supplier 1: LCSC; Category: Inductors; Supplier Part Number 1: C162537; Rated Current: 1A; DC Resistance: 80mΩ; RoHS: Yes; ComponentLink1Description: Datasheet; ComponentLink1URL: https://wmsc.lcsc.com/wmsc/upload/file/pdf/v2/lcsc/2304140030_Murata-Electronics-LQG15HN1N2S02D_C162537.pdf; ComponentLink2Description: JLCPCB Part URL; ComponentLink2URL: https://jlcpcb.com/partdetail/C162537; ComponentLink3Description: LCSC Part URL; ComponentLink3URL: https://lcsc.com/product-detail/Inductors-SMD_Murata-Electronics-Murata-Electronics-LQG15HN1N2S02D_C162537.html
footprint IND-0402 (0402 (1005M) Inductor)
pins: 1, 2

## LQG15HN1N3S02D
designator L?  Inductance: 1.3nH
Inductor, 1.3nH, 80mΩ, 1A, SMD 0402; Manufacturer: Murata Electronics; Manufacturer Part Number: LQG15HN1N3S02D; Self-Resonant Frequency: 6GHz; Q Factor: 8@100MHz; Package Size: 0402; JLCPCB Basic Part: No; JLCPCB Part Number: C701287; Supplier 1: LCSC; Category: Inductors; Supplier Part Number 1: C701287; Rated Current: 1A; DC Resistance: 80mΩ; RoHS: Yes; ComponentLink1Description: Datasheet; ComponentLink1URL: https://wmsc.lcsc.com/wmsc/upload/file/pdf/v2/lcsc/2304140030_Murata-Electronics-LQG15HN1N3S02D_C701287.pdf; ComponentLink2Description: JLCPCB Part URL; ComponentLink2URL: https://jlcpcb.com/partdetail/C701287; ComponentLink3Description: LCSC Part URL; ComponentLink3URL: https://lcsc.com/product-detail/Inductors-SMD_Murata-Electronics-Murata-Electronics-LQG15HN1N3S02D_C701287.html
footprint IND-0402 (0402 (1005M) Inductor)
pins: 1, 2

## LQG15HN1N5B02D
designator L?  Inductance: 1.5nH
Inductor, 1.5nH, 80mΩ, 1A, SMD 0402; Manufacturer: Murata Electronics; Manufacturer Part Number: LQG15HN1N5B02D; Self-Resonant Frequency: 6GHz; Q Factor: 8@100MHz; Package Size: 0402; JLCPCB Basic Part: No; JLCPCB Part Number: C3911113; Supplier 1: LCSC; Category: Inductors; Supplier Part Number 1: C3911113; Rated Current: 1A; DC Resistance: 80mΩ; RoHS: Yes; ComponentLink1Description: Datasheet; ComponentLink1URL: https://wmsc.lcsc.com/wmsc/upload/file/pdf/v2/lcsc/2308111426_Murata-Electronics-LQG15HN1N5B02D_C3911113.pdf; ComponentLink2Description: JLCPCB Part URL; ComponentLink2URL: https://jlcpcb.com/partdetail/C3911113; ComponentLink3Description: LCSC Part URL; ComponentLink3URL: https://lcsc.com/product-detail/Inductors-SMD_Murata-Electronics-Murata-Electronics-LQG15HN1N5B02D_C3911113.html
footprint IND-0402 (0402 (1005M) Inductor)
pins: 1, 2

## LQG15HN1N5S02D
designator L?  Inductance: 1.5nH
Inductor, 1.5nH, 80mΩ, 1A, SMD 0402; Manufacturer: Murata Electronics; Manufacturer Part Number: LQG15HN1N5S02D; Self-Resonant Frequency: 6GHz; Q Factor: 8@100MHz; Package Size: 0402; JLCPCB Basic Part: No; JLCPCB Part Number: C113053; Supplier 1: LCSC; Category: Inductors; Supplier Part Number 1: C113053; Rated Current: 1A; DC Resistance: 80mΩ; RoHS: Yes; ComponentLink1Description: Datasheet; ComponentLink1URL: https://wmsc.lcsc.com/wmsc/upload/file/pdf/v2/lcsc/2304140030_Murata-Electronics-LQG15HN1N5S02D_C113053.pdf; ComponentLink2Description: JLCPCB Part URL; ComponentLink2URL: https://jlcpcb.com/partdetail/C113053; ComponentLink3Description: LCSC Part URL; ComponentLink3URL: https://lcsc.com/product-detail/Inductors-SMD_Murata-Electronics-Murata-Electronics-LQG15HN1N5S02D_C113053.html
footprint IND-0402 (0402 (1005M) Inductor)
pins: 1, 2

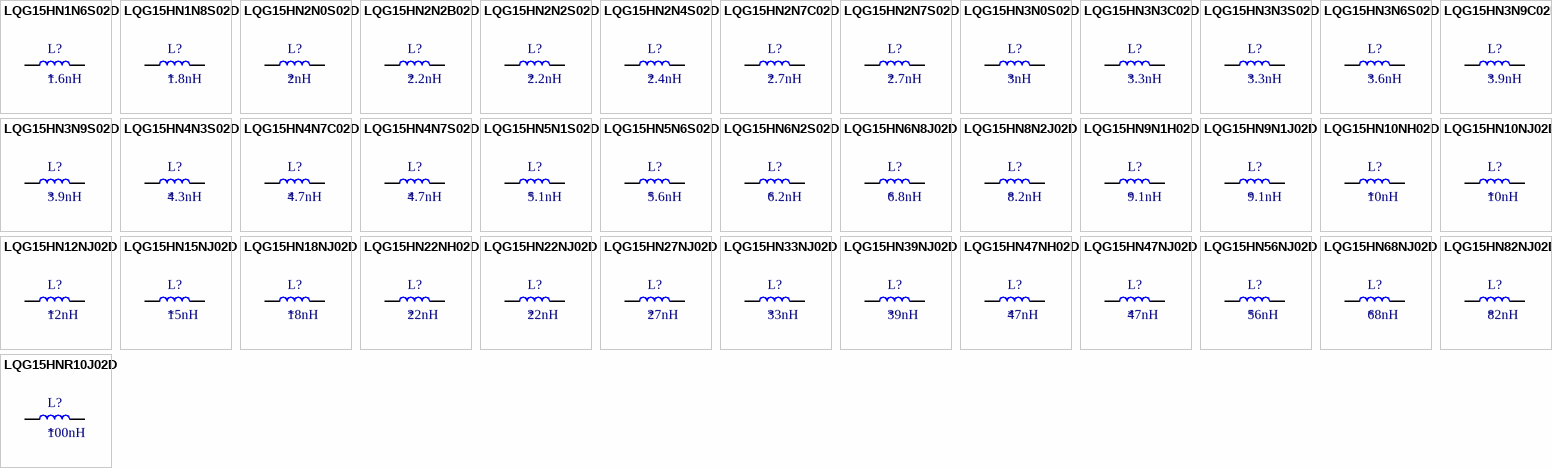
[diagram p8: symbols LQG15HN1N6S02D to LQG15HNR10J02D]

## LQG15HN1N6S02D
designator L?  Inductance: 1.6nH
Inductor, 1.6nH, 80mΩ, 1A, SMD 0402; Manufacturer: Murata Electronics; Manufacturer Part Number: LQG15HN1N6S02D; Self-Resonant Frequency: 6GHz; Q Factor: 8@100MHz; Package Size: 0402; JLCPCB Basic Part: No; JLCPCB Part Number: C435417; Supplier 1: LCSC; Category: Inductors; Supplier Part Number 1: C435417; Rated Current: 1A; DC Resistance: 80mΩ; RoHS: Yes; ComponentLink1Description: Datasheet; ComponentLink1URL: https://wmsc.lcsc.com/wmsc/upload/file/pdf/v2/lcsc/2304140030_Murata-Electronics-LQG15HN1N6S02D_C435417.pdf; ComponentLink2Description: JLCPCB Part URL; ComponentLink2URL: https://jlcpcb.com/partdetail/C435417; ComponentLink3Description: LCSC Part URL; ComponentLink3URL: https://lcsc.com/product-detail/Inductors-SMD_Murata-Electronics-Murata-Electronics-LQG15HN1N6S02D_C435417.html
footprint IND-0402 (0402 (1005M) Inductor)
pins: 1, 2

## LQG15HN1N8S02D
designator L?  Inductance: 1.8nH
Inductor, 1.8nH, 80mΩ, 900mA, SMD 0402; Manufacturer: Murata Electronics; Manufacturer Part Number: LQG15HN1N8S02D; Self-Resonant Frequency: 6GHz; Q Factor: 8@100MHz; Package Size: 0402; JLCPCB Basic Part: No; JLCPCB Part Number: C97982; Supplier 1: LCSC; Category: Inductors; Supplier Part Number 1: C97982; Rated Current: 900mA; DC Resistance: 80mΩ; RoHS: Yes; ComponentLink1Description: Datasheet; ComponentLink1URL: https://wmsc.lcsc.com/wmsc/upload/file/pdf/v2/lcsc/2304140030_Murata-Electronics-LQG15HN1N8S02D_C97982.pdf; ComponentLink2Description: JLCPCB Part URL; ComponentLink2URL: https://jlcpcb.com/partdetail/C97982; ComponentLink3Description: LCSC Part URL; ComponentLink3URL: https://lcsc.com/product-detail/Inductors-SMD_Murata-Electronics-Murata-Electronics-LQG15HN1N8S02D_C97982.html
footprint IND-0402 (0402 (1005M) Inductor)
pins: 1, 2

## LQG15HN2N0S02D
designator L?  Inductance: 2nH
Inductor, 2nH, 90mΩ, 900mA, SMD 0402; Manufacturer: Murata Electronics; Manufacturer Part Number: LQG15HN2N0S02D; Self-Resonant Frequency: 6GHz; Q Factor: 8@100MHz; Package Size: 0402; JLCPCB Basic Part: No; JLCPCB Part Number: C97984; Supplier 1: LCSC; Category: Inductors; Supplier Part Number 1: C97984; Rated Current: 900mA; DC Resistance: 90mΩ; RoHS: Yes; ComponentLink1Description: Datasheet; ComponentLink1URL: https://wmsc.lcsc.com/wmsc/upload/file/pdf/v2/lcsc/2304140030_Murata-Electronics-LQG15HN2N0S02D_C97984.pdf; ComponentLink2Description: JLCPCB Part URL; ComponentLink2URL: https://jlcpcb.com/partdetail/C97984; ComponentLink3Description: LCSC Part URL; ComponentLink3URL: https://lcsc.com/product-detail/Inductors-SMD_Murata-Electronics-Murata-Electronics-LQG15HN2N0S02D_C97984.html
footprint IND-0402 (0402 (1005M) Inductor)
pins: 1, 2

## LQG15HN2N2B02D
designator L?  Inductance: 2.2nH
Inductor, 2.2nH, 90mΩ, 900mA, SMD 0402; Manufacturer: Murata Electronics; Manufacturer Part Number: LQG15HN2N2B02D; Self-Resonant Frequency: 6GHz; Q Factor: 8@100MHz; Package Size: 0402; JLCPCB Basic Part: No; JLCPCB Part Number: C6652831; Supplier 1: LCSC; Category: Inductors; Supplier Part Number 1: C6652831; Rated Current: 900mA; DC Resistance: 90mΩ; RoHS: Yes; ComponentLink1Description: Datasheet; ComponentLink1URL: https://wmsc.lcsc.com/wmsc/upload/file/pdf/v2/lcsc/2308111508_Murata-Electronics-LQG15HN2N2B02D_C6652831.pdf; ComponentLink2Description: JLCPCB Part URL; ComponentLink2URL: https://jlcpcb.com/partdetail/C6652831; ComponentLink3Description: LCSC Part URL; ComponentLink3URL: https://lcsc.com/product-detail/Inductors-SMD_Murata-Electronics-Murata-Electronics-LQG15HN2N2B02D_C6652831.html
footprint IND-0402 (0402 (1005M) Inductor)
pins: 1, 2

## LQG15HN2N2S02D
designator L?  Inductance: 2.2nH
Inductor, 2.2nH, 90mΩ, 900mA, SMD 0402; Manufacturer: Murata Electronics; Manufacturer Part Number: LQG15HN2N2S02D; Self-Resonant Frequency: 6GHz; Q Factor: 8@100MHz; Package Size: 0402; JLCPCB Basic Part: No; JLCPCB Part Number: C97985; Supplier 1: LCSC; Category: Inductors; Supplier Part Number 1: C97985; Rated Current: 900mA; DC Resistance: 90mΩ; RoHS: Yes; ComponentLink1Description: Datasheet; ComponentLink1URL: https://wmsc.lcsc.com/wmsc/upload/file/pdf/v2/lcsc/2304140030_Murata-Electronics-LQG15HN2N2S02D_C97985.pdf; ComponentLink2Description: JLCPCB Part URL; ComponentLink2URL: https://jlcpcb.com/partdetail/C97985; ComponentLink3Description: LCSC Part URL; ComponentLink3URL: https://lcsc.com/product-detail/Inductors-SMD_Murata-Electronics-Murata-Electronics-LQG15HN2N2S02D_C97985.html
footprint IND-0402 (0402 (1005M) Inductor)
pins: 1, 2
